# Altium footprint library Library.PcbLib: 292 footprints (part 19 of 20)
Each footprint in its own frame and in the unit in brackets; x right, y up, seen from the top. Pads: shape width x height; smd on the part's side, far side on the other; paste and mask are expansions set on the pad; w line width, h text height; cw(c..) or ccw(c..) is an arc to the next point about the centre after c.
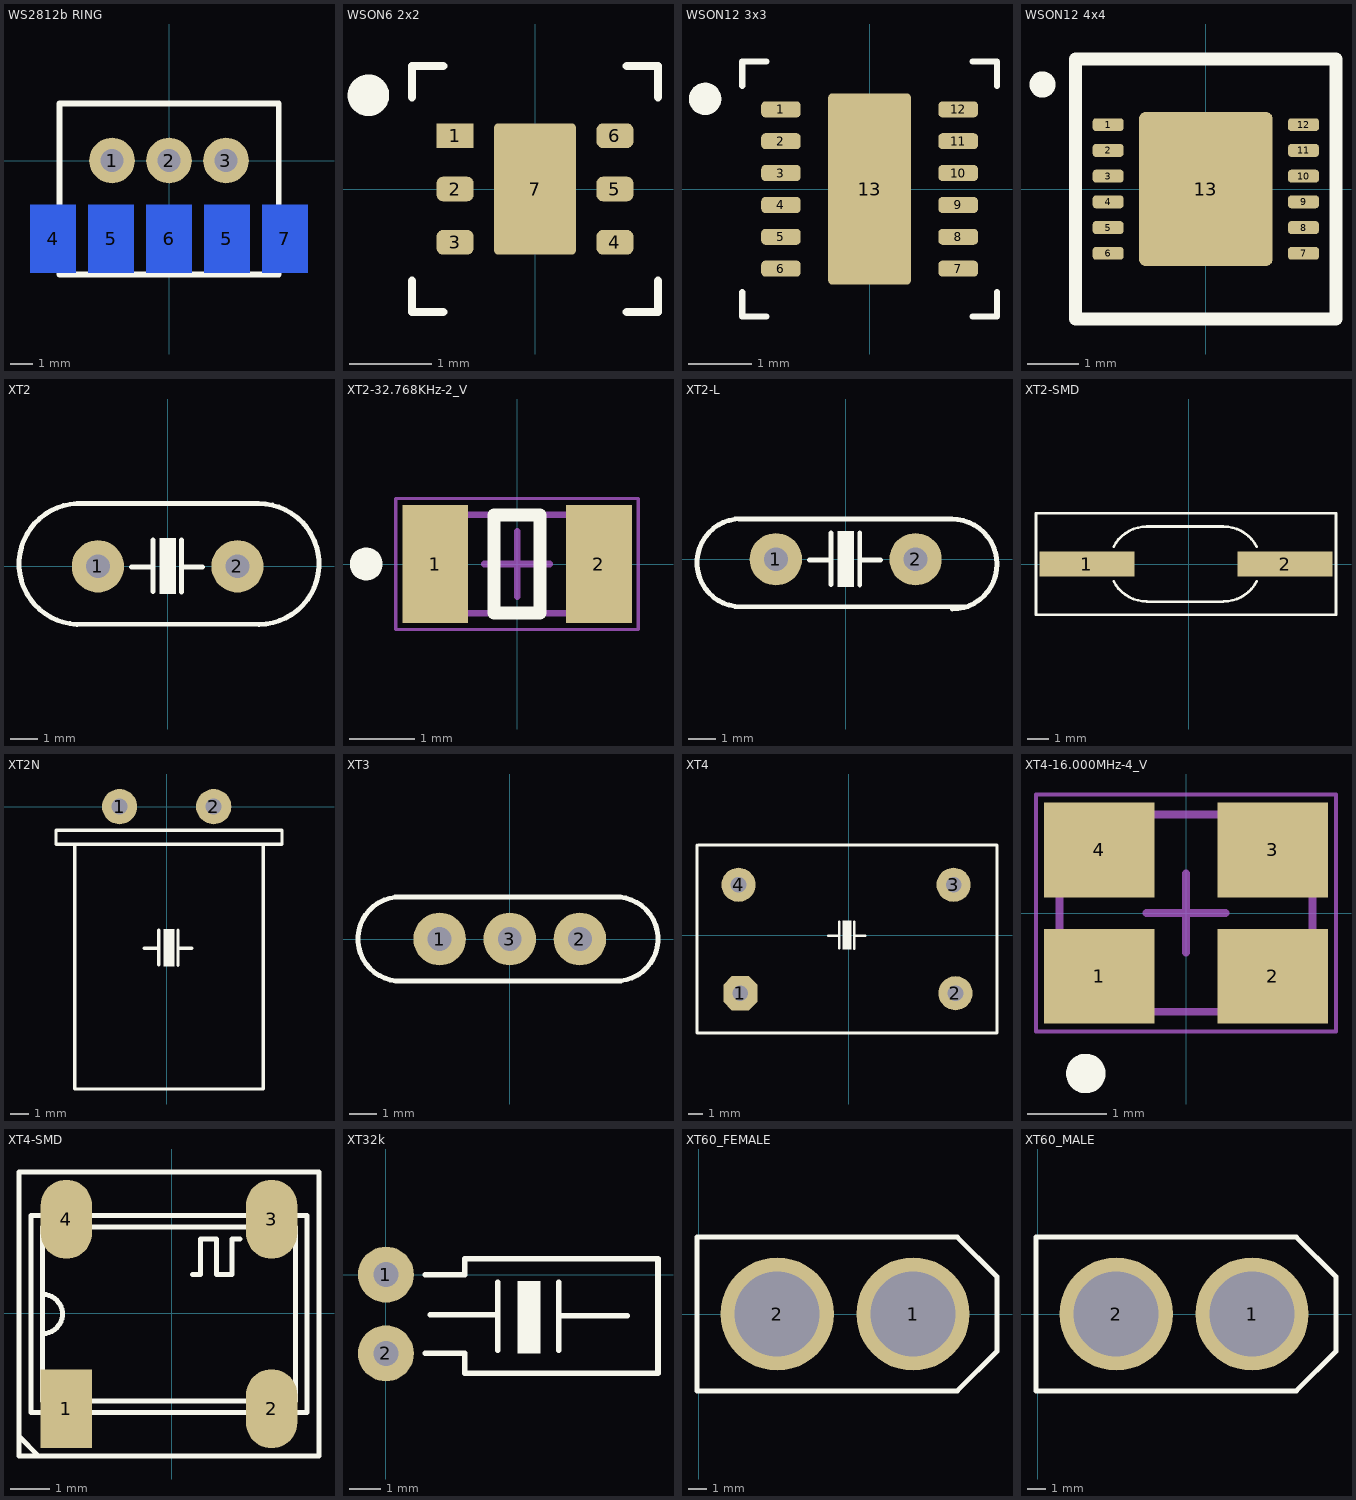
[diagram p18: the footprints below, top view; thin cyan lines are the x and y axes]

## WS2812b RING [mm]
pads (8):
  round 2 hole 1: 1(-2.5,0) 2(0,0) 3(2.5,0)
  rect 2x3 smd far side: 4(-5.08,-3.432) 5(-2.54,-3.432) 5(2.54,-3.432) 6(0,-3.432) 7(5.08,-3.432)
Top Overlay:
  lines w0.254: -4.8,-5 4.81,-5 4.81,2.5 -4.8,2.5 -4.8,-5
3D body "LED.step": height 22.5, standoff -11.5, extent -16.983,-3.285 17,-2.034
3D body "RD901F-20-15R1.stp": height 11.3, standoff -3.5, extent -4.8,-19.8 4.8,2.5

## WSON6 2x2 [mm] "TI Footprint 3x3mm"
pads (7):
  rect 0.45x0.3 smd mask+0.07: 1(-0.975,0.65)
  rrect50% 0.45x0.3 smd mask+0.07: 2(-0.975,0) 3(-0.975,-0.65) 4(0.975,-0.65) 5(0.975,0) 6(0.975,0.65)
  rrect10% 1x1.6 smd mask+0.07: 7(0,0)
Top Overlay:
  circle w0.254: c-2.032,1.143 r0.127
  lines w0.1: -1.5,-1.119 -1.5,-1.5 -1.119,-1.5 ; -1.5,1.119 -1.5,1.5 -1.119,1.5 ; 1.119,-1.5 1.5,-1.5 1.5,-1.119 ; 1.119,1.5 1.5,1.5 1.5,1.119
3D body "User Library-DRV6.step": height 0.85, standoff 0.05, extent -1.01,-1.01 1.01,1.01

## WSON12 3x3 [mm] "TI Footprint 3x3mm"
pads (13):
  rrect50% 0.62x0.25 smd paste-2539.97 mask+0.07: 1(-1.39,1.25) 2(-1.39,0.75) 3(-1.39,0.25) 4(-1.39,-0.25) 5(-1.39,-0.75) 6(-1.39,-1.25) 7(1.39,-1.25) 8(1.39,-0.75) 9(1.39,-0.25) 10(1.39,0.25) 11(1.39,0.75) 12(1.39,1.25)
  rrect10% 1.3x3 smd paste-2539.97 mask+0.07: 13(0,0)
Top Overlay:
  circle w0.254: c-2.581,1.414 r0.127
  lines w0.1: -2,-1.619 -2,-2 -1.619,-2 ; -2,1.619 -2,2 -1.619,2 ; 1.619,-2 2,-2 2,-1.619 ; 1.619,2 2,2 2,1.619
Top Solder:
  drawing of 13 lines, arcs and shapes, not listed
3D body "User Library-ALM2402-Q1(WSON-12-3x3-0_5).STEP": height 0.8, standoff 0, extent -1.5,-1.5 1.5,1.5

## WSON12 4x4 [mm] "TI Footprint 4x4mm"
pads (13):
  rrect50% 0.6x0.25 smd paste-2539.97 mask+0.07: 1(-1.9,1.25) 2(-1.9,0.75) 3(-1.9,0.25) 4(-1.9,-0.25) 5(-1.9,-0.75) 6(-1.9,-1.25) 7(1.9,-1.25) 8(1.9,-0.75) 9(1.9,-0.25) 10(1.9,0.25) 11(1.9,0.75) 12(1.9,1.25)
  rrect10% 2.6x3 smd paste-2539.97 mask+0.07: 13(0,0)
Top Overlay:
  circle w0.254: c-3.175,2.032 r0.127
  lines w0.254: -2.532,-2.532 2.532,-2.532 2.532,2.532 -2.532,2.532 -2.532,-2.532
Top Solder:
  drawing of 13 lines, arcs and shapes, not listed
3D body "User Library-LP39798-2.step": height 0.8, standoff 0, extent -2,-2 2,2

## XT2 [mil] "Footpin for Crystal 2 pin"
pads (2):
  round 75 hole 34: 1(-100,0) 2(100,0)
Top Overlay:
  region: 11.5,40 11.5,-39 -11.5,-39 -11.5,40
  lines w7: -135,-82.99 130,-82.99 ; -130,-83.09 cw(c-126.52,3.46) -130,90 130,90 cw(c130.27,3.39) 130.84,-83.23 ; -52,-1 -21,-1 ; -21,-36 -21,38 ; 20,-37 20,38 ; 20,-1 50,-1
3D body "User Library-HC49S-1.STEP": height 143.7, standoff -116.14, extent -216.14,-86.81 216.14,90

## XT2-32.768KHz-2_V [mm] "Hand Drawn, 2-Leads, Body 3.2x1.5mm, Pitch 2.5mm"
height 0.9
pads (2):
  rect 1x1.8 smd: 1(-1.25,0) 2(1.25,0)
Top Overlay:
  circle w0.25: c-2.3,0 r0.125
  lines w0.2: -0.35,-0.75 0.35,-0.75 0.35,0.75 -0.35,0.75 -0.35,-0.75
Mechanical 13:
  lines w0.1: -1.6,-0.75 -1.6,0.75 1.6,0.75 1.6,-0.75 -1.6,-0.75
Mechanical 15:
  lines w0.05: -1.85,-1 1.85,-1 1.85,1 -1.85,1 -1.85,-1
  lines w0.1: -0.5,0 0.5,0 ; 0,-0.5 0,0.5
3D body: height 0.9, standoff 0, extent -1.6,-0.75 1.6,0.75

## XT2-L [mil] "Footpin for Crystal 2 pin"
pads (2):
  round 75 hole 34: 1(-100,0) 2(100,0)
Top Overlay:
  region: 11.5,40 11.5,-39 -11.5,-39 -11.5,40
  lines w7: -152.59,57.53 152.1,57.53 ; -150,57.99 ccw(c-150,-5) -150,-67.99 175,-67.99 ; -52,-1 -21,-1 ; -21,-36 -21,38 ; 20,-37 20,38 ; 20,-1 50,-1 ; 151.9,57.53 cw(c152.1,-7) 152.52,-71.53
3D body "CircuitWorks-XTAL1.step": height 460, standoff -100, extent -210,-65 210,55

## XT2-SMD [mm]
pads (2):
  rect 4.5x1.2 smd: 1(-4.826,0) 2(4.572,0)
Top Overlay:
  lines w0.127: -3.556,-0.825 ccw(c-1.981,0) -1.981,-1.778 ; -3.556,0.825 cw(c-1.981,0) -1.981,1.778 ; -1.956,1.778 1.651,1.778 cw(c1.651,0) 3.226,0.825 ; -1.93,-1.787 1.626,-1.787 ; 1.651,-1.778 ccw(c1.651,0) 3.226,-0.825 ; -7.239,-2.413 -7.239,2.413 6.985,2.413 6.985,-2.413 -7.239,-2.413
3D body: height 4.3, standoff 0, extent -6.527,-2.415 6.273,2.415
3D body: height 0.25, standoff 0, extent -4.534,-0.419 -3.213,0.394
3D body: height 0.25, standoff 0, extent 2.832,-0.419 4.153,0.394

## XT2N [mil] "Crystal 2pin, high 200 mil"
height 200
pads (2):
  round 75 hole 34: 1(-100,0) 2(100,0)
Top Overlay:
  region: 16.5,-260 16.5,-339 -6.5,-339 -6.5,-260
  lines w7: -48,-301 -17,-301 ; -17,-336 -17,-262 ; 24,-337 24,-262 ; 24,-301 54,-301 ; -235,-80 -195,-80 ; -235,-80 -235,-50 ; -235,-80 -195,-80 ; -235,-80 -235,-50 ; -235,-50 245,-50 ; -235,-50 245,-50 ; -195,-600 -195,-80 ; -195,-600 205,-600 ; -195,-600 -195,-80 ; -195,-600 205,-600 ; -195,-80 205,-80 ; -195,-80 205,-80 ; 205,-600 205,-80 ; 205,-600 205,-80 ; 205,-80 245,-80 ; 205,-80 245,-80 ; 245,-80 245,-50 ; 245,-80 245,-50
3D body "User Library-MCCOY_R60.step": height 132.28, standoff 0, extent -145.99,-432.49 156.37,32.51
3D body "SW3dPS-HC49U.STEP": height 91.44, standoff -92.52, extent -209.86,-594.33 230,14.33

## XT3 [mil]
pads (3):
  round 75 hole 34: 1(-100,0) 2(100,0) 3(0,0)
Top Overlay:
  lines w7: 149.38,59.95 cw(c151.36,-0.02) 150,-60 -154.38,-59.95 cw(c-156.36,0.02) -155,60 149.38,60
3D body "User Library-XTAL2.step": height 126.52, standoff -95.28, extent -212,-60 208,60

## XT4 [mm]
pads (4):
  oct 2.4x2.4 hole 1.1: 1(-7.62,-4.064)
  round 2.4 hole 1.1: 2(7.493,-4.064) 3(7.366,3.556) 4(-7.747,3.556)
Top Overlay:
  region: 0.165,1.016 0.165,-0.991 -0.419,-0.991 -0.419,1.016
  lines w0.178: -1.448,-0.025 -0.66,-0.025 ; -0.66,-0.914 -0.66,0.965 ; 0.381,-0.94 0.381,0.965 ; 0.381,-0.025 1.143,-0.025
  lines w0.2: -10.668,6.35 -10.668,-6.858 10.414,-6.858 10.414,6.35 -10.541,6.35
3D body "User Library-osilator.step": height 7.27, standoff -5, extent -10.527,-6.794 10.273,6.286

## XT4-16.000MHz-4_V [mm] "Hand Drawn, 4-Leads, Body 3.2x2.5 mm"
height 0.9
pads (4):
  rect 1.4x1.2 smd: 1(-1.1,-0.8) 2(1.1,-0.8) 3(1.1,0.8) 4(-1.1,0.8)
Top Overlay:
  circle w0.25: c-1.27,-2.032 r0.125
Mechanical 13:
  lines w0.1: -1.6,-1.25 -1.6,1.25 1.6,1.25 1.6,-1.25 -1.6,-1.25
Mechanical 15:
  lines w0.05: -1.9,-1.5 -1.9,1.5 1.9,1.5 1.9,-1.5 -1.9,-1.5
  lines w0.1: -0.5,0 0.5,0 ; 0,-0.5 0,0.5
3D body: height 0.9, standoff 0, extent -1.6,-1.25 1.6,1.25

## XT4-SMD [mm]
pads (4):
  rect 1.3x2 smd: 1(-2.667,-2.413)
  oval 1.3x2 smd: 2(2.533,-2.413) 3(2.533,2.387) 4(-2.667,2.387)
Top Overlay:
  lines w0.127: -3.867,-3.313 -3.867,-3.113 -3.367,-3.613 -3.267,-3.613 ; -3.267,-0.513 ccw(c-3.267,-0.013) -3.267,0.487 ; 0.533,0.987 0.733,0.987 0.733,1.887 1.133,1.887 1.133,0.987 1.533,0.987 1.533,1.887 1.733,1.887 ; -3.867,-3.613 -3.867,3.587 3.733,3.587 3.733,-3.613 0.833,-3.613 -3.867,-3.613 ; -3.567,-2.513 3.433,-2.513 3.433,2.487 -3.567,2.487 -3.567,-2.513 ; -3.267,-2.213 3.133,-2.213 3.133,2.187 -3.267,2.187 -3.267,-2.213
3D body: height 1.27, standoff 0, extent -3.581,-2.489 3.429,2.464
3D body: height 1.3, standoff 0, extent 2.07,2.095 2.984,2.476
3D body: height 1.3, standoff 0, extent -3.13,2.095 -2.215,2.476
3D body: height 1.3, standoff 0, extent -3.119,-2.503 -2.204,-1.778
3D body: height 1.3, standoff 0, extent 2.081,-2.502 2.996,-2.121
3D body: height 1.3, standoff 1.27, extent -3.175,-2.032 3.048,2.032
3D body: height 2.03, standoff 1.3, extent -3.048,-1.905 2.921,1.905

## XT32k [mm]
pads (2):
  round 1.8 hole 0.813: 1(0,0) 2(0,-2.54)
Top Overlay:
  rectangle: 4.242,-2.54 4.978,-0.203
  lines w0.178: 1.27,-2.54 2.54,-2.54 2.54,-3.175 8.763,-3.175 8.763,0.508 2.54,0.508 2.54,0 1.27,0 ; 1.422,-1.295 3.607,-1.295 ; 3.607,-2.438 3.607,-0.254 ; 5.563,-2.438 5.563,-0.254 ; 5.588,-1.321 7.772,-1.321
3D body "User Library-KX-26.step": height 1.95, standoff -2, extent -0.145,-2.42 8.205,-0.12

## XT60_FEMALE [mm]
pads (2):
  round 6 hole 4.5: 1(11.35,0) 2(4.15,0)
Top Overlay:
  lines w0.254: -0.1,-4.075 -0.1,4.075 13.705,4.075 15.8,1.98 15.8,-1.98 13.705,-4.075 -0.1,-4.075
3D body "User Library-XT60 female.step": height 18, standoff -4.2, extent -0.1,-4.075 15.8,4.075

## XT60_MALE [mm]
pads (2):
  round 6 hole 4.5: 1(11.35,0) 2(4.15,0)
Top Overlay:
  lines w0.254: -0.1,-4.075 13.705,-4.075 15.8,-1.98 15.8,1.98 13.705,4.075 -0.1,4.075 -0.1,-4.075
3D body "User Library-XT60 male.step": height 17, standoff -4.2, extent -0.1,-4.075 15.8,4.075